# Altium integrated library WR-FPC_rev19a.IntLib: 242 symbols (part 1 of 2) (continued)
## 686118188622
designator J?
WR-FPC SMT LIF Horizontal Top Contact, pitch 1mm, 18p; Part Number: 686118188622; Contact Resistance: 30mOhm; Pin Number: 18; Working Voltage: 125VAC; Rated Current: 1A; ComponentLink1Description: Manufacturer; ComponentLink1URL: http://www.we-online.de; ComponentLink2Description: Datasheet; ComponentLink2URL: https://katalog.we-online.com/em/datasheet/686118188622.pdf; Packaging: Tape and Reel; Pitch: 1mm; Published Date: November 2019; Mounting Technology: SMT; Operating Temperature: -25 to +85degC; Length: 21.8mm; Type: Horizontal; Publisher: Wurth Elektronik
footprint 686118188622
pins: 1, 2, 3, 4, 5, 6, 7, 8, 9, 10, 11, 12, 13, 14, 15, 16, 17, 18, MP1, MP2

## 686118188822
designator J?
WR-FPC SMT LIF Vertical Type A, pitch 1mm, 18p; Part Number: 686118188822; Contact Resistance: 30mOhm; Pin Number: 18; Working Voltage: 125VAC; Rated Current: 1A; ComponentLink1Description: Manufacturer; ComponentLink1URL: http://www.we-online.de; ComponentLink2Description: Datasheet; ComponentLink2URL: https://katalog.we-online.com/em/datasheet/686118188822.pdf; Packaging: Tape and Reel; Pitch: 1mm; Published Date: November 2019; Mounting Technology: SMT; Operating Temperature: -25 to +85degC; Length: 21mm; Type: Vertical; Publisher: Wurth Elektronik
footprint 686118188822
pins: 1, 2, 3, 4, 5, 6, 7, 8, 9, 10, 11, 12, 13, 14, 15, 16, 17, 18

## 686120148922
designator J?
WR-FPC SMT ZIF Horizontal Bottom Contact Hinge Type, pitch 1mm, 20p; Part Number: 686120148922; Contact Resistance: 50mOhm; Pin Number: 20; Working Voltage: 100VAC; Rated Current: 1A; ComponentLink1Description: Manufacturer; ComponentLink1URL: http://www.we-online.de; ComponentLink2Description: Datasheet; ComponentLink2URL: https://katalog.we-online.com/em/datasheet/686120148922.pdf; Packaging: Tape and Reel; Pitch: 1mm; Published Date: November 2019; Mounting Technology: SMT; Operating Temperature: -25 to +85degC; Length: 24.6mm; Type: Horizontal; Publisher: Wurth Elektronik
footprint 686120148922
pins: 1, 2, 3, 4, 5, 6, 7, 8, 9, 10, 11, 12, 13, 14, 15, 16, 17, 18, 19, 20, MP1, MP2

## 686120183822
designator J?
WR-FPC SMT ZIF Vertical Type A, pitch 1mm, 20p; Part Number: 686120183822; Contact Resistance: 30mOhm; Pin Number: 20; Working Voltage: 125VAC; Rated Current: 1A; ComponentLink1Description: Manufacturer; ComponentLink1URL: http://www.we-online.de; ComponentLink2Description: Datasheet; ComponentLink2URL: https://katalog.we-online.com/em/datasheet/686120183822.pdf; Packaging: Tape and Reel; Pitch: 1mm; Published Date: November 2019; Mounting Technology: SMT; Operating Temperature: -25 to +85degC; Length: 26.8mm; Type: Vertical; Publisher: Wurth Elektronik
footprint 686120183822
pins: 1, 2, 3, 4, 5, 6, 7, 8, 9, 10, 11, 12, 13, 14, 15, 16, 17, 18, 19, 20, MP1, MP2, MP3, MP4

## 686120188622
designator J?
WR-FPC SMT LIF Horizontal Top Contact, pitch 1mm, 20p; Part Number: 686120188622; Contact Resistance: 30mOhm; Pin Number: 20; Working Voltage: 125VAC; Rated Current: 1A; ComponentLink1Description: Manufacturer; ComponentLink1URL: http://www.we-online.de; ComponentLink2Description: Datasheet; ComponentLink2URL: https://katalog.we-online.com/em/datasheet/686120188622.pdf; Packaging: Tape and Reel; Pitch: 1mm; Published Date: November 2019; Mounting Technology: SMT; Operating Temperature: -25 to +85degC; Length: 23.8mm; Type: Horizontal; Publisher: Wurth Elektronik
footprint 686120188622
pins: 1, 2, 3, 4, 5, 6, 7, 8, 9, 10, 11, 12, 13, 14, 15, 16, 17, 18, 19, 20, MP1, MP2

## 686120188822
designator J?
WR-FPC SMT LIF Vertical Type A, pitch 1mm, 20p; Part Number: 686120188822; Contact Resistance: 30mOhm; Pin Number: 20; Working Voltage: 125VAC; Rated Current: 1A; ComponentLink1Description: Manufacturer; ComponentLink1URL: http://www.we-online.de; ComponentLink2Description: Datasheet; ComponentLink2URL: https://katalog.we-online.com/em/datasheet/686120188822.pdf; Packaging: Tape and Reel; Pitch: 1mm; Published Date: November 2019; Mounting Technology: SMT; Operating Temperature: -25 to +85degC; Length: 23mm; Type: Vertical; Publisher: Wurth Elektronik
footprint 686120188822
pins: 1, 2, 3, 4, 5, 6, 7, 8, 9, 10, 11, 12, 13, 14, 15, 16, 17, 18, 19, 20

## 686122148922
designator J?
WR-FPC SMT ZIF Horizontal Bottom Contact Hinge Type, pitch 1mm, 22p; Part Number: 686122148922; Contact Resistance: 50mOhm; Pin Number: 22; Working Voltage: 100VAC; Rated Current: 1A; ComponentLink1Description: Manufacturer; ComponentLink1URL: http://www.we-online.de; ComponentLink2Description: Datasheet; ComponentLink2URL: https://katalog.we-online.com/em/datasheet/686122148922.pdf; Packaging: Tape and Reel; Pitch: 1mm; Published Date: November 2019; Mounting Technology: SMT; Operating Temperature: -25 to +85degC; Length: 26.6mm; Type: Horizontal; Publisher: Wurth Elektronik
footprint 686122148922
pins: 1, 2, 3, 4, 5, 6, 7, 8, 9, 10, 11, 12, 13, 14, 15, 16, 17, 18, 19, 20, 21, 22, MP1, MP2

## 686122183822
designator J?
WR-FPC SMT ZIF Vertical Type A, pitch 1mm, 22p; Part Number: 686122183822; Contact Resistance: 30mOhm; Pin Number: 22; Working Voltage: 125VAC; Rated Current: 1A; ComponentLink1Description: Manufacturer; ComponentLink1URL: http://www.we-online.de; ComponentLink2Description: Datasheet; ComponentLink2URL: https://katalog.we-online.com/em/datasheet/686122183822.pdf; Packaging: Tape and Reel; Pitch: 1mm; Published Date: November 2019; Mounting Technology: SMT; Operating Temperature: -25 to +85degC; Length: 28.8mm; Type: Vertical; Publisher: Wurth Elektronik
footprint 686122183822
pins: 1, 2, 3, 4, 5, 6, 7, 8, 9, 10, 11, 12, 13, 14, 15, 16, 17, 18, 19, 20, 21, 22, MP1, MP2, MP3, MP4

## 686122188622
designator J?
WR-FPC SMT LIF Horizontal Top Contact, pitch 1mm, 22p; Part Number: 686122188622; Contact Resistance: 30mOhm; Pin Number: 22; Working Voltage: 125VAC; Rated Current: 1A; ComponentLink1Description: Manufacturer; ComponentLink1URL: http://www.we-online.de; ComponentLink2Description: Datasheet; ComponentLink2URL: https://katalog.we-online.com/em/datasheet/686122188622.pdf; Packaging: Tape and Reel; Pitch: 1mm; Published Date: November 2019; Mounting Technology: SMT; Operating Temperature: -25 to +85degC; Length: 25.8mm; Type: Horizontal; Publisher: Wurth Elektronik
footprint 686122188622
pins: 1, 2, 3, 4, 5, 6, 7, 8, 9, 10, 11, 12, 13, 14, 15, 16, 17, 18, 19, 20, 21, 22, MP1, MP2

## 686122188822
designator J?
WR-FPC SMT LIF Vertical Type A, pitch 1mm, 22p; Part Number: 686122188822; Contact Resistance: 30mOhm; Pin Number: 22; Working Voltage: 125VAC; Rated Current: 1A; ComponentLink1Description: Manufacturer; ComponentLink1URL: http://www.we-online.de; ComponentLink2Description: Datasheet; ComponentLink2URL: https://katalog.we-online.com/em/datasheet/686122188822.pdf; Packaging: Tape and Reel; Pitch: 1mm; Published Date: November 2019; Mounting Technology: SMT; Operating Temperature: -25 to +85degC; Length: 25mm; Type: Vertical; Publisher: Wurth Elektronik
footprint 686122188822
pins: 1, 2, 3, 4, 5, 6, 7, 8, 9, 10, 11, 12, 13, 14, 15, 16, 17, 18, 19, 20, 21, 22

## 686124148922
designator J?
WR-FPC SMT ZIF Horizontal Bottom Contact Hinge Type, pitch 1mm, 24p; Part Number: 686124148922; Contact Resistance: 50mOhm; Pin Number: 24; Working Voltage: 100VAC; Rated Current: 1A; ComponentLink1Description: Manufacturer; ComponentLink1URL: http://www.we-online.de; ComponentLink2Description: Datasheet; ComponentLink2URL: https://katalog.we-online.com/em/datasheet/686124148922.pdf; Packaging: Tape and Reel; Pitch: 1mm; Published Date: November 2019; Mounting Technology: SMT; Operating Temperature: -25 to +85degC; Length: 28.6mm; Type: Horizontal; Publisher: Wurth Elektronik
footprint 686124148922
pins: 1, 2, 3, 4, 5, 6, 7, 8, 9, 10, 11, 12, 13, 14, 15, 16, 17, 18, 19, 20, 21, 22, 23, 24, MP1, MP2

## 686124183822
designator J?
WR-FPC SMT ZIF Vertical Type A, pitch 1mm, 24p; Part Number: 686124183822; Contact Resistance: 30mOhm; Pin Number: 24; Working Voltage: 125VAC; Rated Current: 1A; ComponentLink1Description: Manufacturer; ComponentLink1URL: http://www.we-online.de; ComponentLink2Description: Datasheet; ComponentLink2URL: https://katalog.we-online.com/em/datasheet/686124183822.pdf; Packaging: Tape and Reel; Pitch: 1mm; Published Date: November 2019; Mounting Technology: SMT; Operating Temperature: -25 to +85degC; Length: 30.8mm; Type: Vertical; Publisher: Wurth Elektronik
footprint 686124183822
pins: 1, 2, 3, 4, 5, 6, 7, 8, 9, 10, 11, 12, 13, 14, 15, 16, 17, 18, 19, 20, 21, 22, 23, 24, MP1, MP2, MP3, MP4

## 686124188622
designator J?
WR-FPC SMT LIF Horizontal Top Contact, pitch 1mm, 24p; Part Number: 686124188622; Contact Resistance: 30mOhm; Pin Number: 24; Working Voltage: 125VAC; Rated Current: 1A; ComponentLink1Description: Manufacturer; ComponentLink1URL: http://www.we-online.de; ComponentLink2Description: Datasheet; ComponentLink2URL: https://katalog.we-online.com/em/datasheet/686124188622.pdf; Packaging: Tape and Reel; Pitch: 1mm; Published Date: November 2019; Mounting Technology: SMT; Operating Temperature: -25 to +85degC; Length: 27.8mm; Type: Horizontal; Publisher: Wurth Elektronik
footprint 686124188622
pins: 1, 2, 3, 4, 5, 6, 7, 8, 9, 10, 11, 12, 13, 14, 15, 16, 17, 18, 19, 20, 21, 22, 23, 24, MP1, MP2

## 686124188822
designator J?
WR-FPC SMT LIF Vertical Type A, pitch 1mm, 24p; Part Number: 686124188822; Contact Resistance: 30mOhm; Pin Number: 24; Working Voltage: 125VAC; Rated Current: 1A; ComponentLink1Description: Manufacturer; ComponentLink1URL: http://www.we-online.de; ComponentLink2Description: Datasheet; ComponentLink2URL: https://katalog.we-online.com/em/datasheet/686124188822.pdf; Packaging: Tape and Reel; Pitch: 1mm; Published Date: November 2019; Mounting Technology: SMT; Operating Temperature: -25 to +85degC; Length: 27mm; Type: Vertical; Publisher: Wurth Elektronik
footprint 686124188822
pins: 1, 2, 3, 4, 5, 6, 7, 8, 9, 10, 11, 12, 13, 14, 15, 16, 17, 18, 19, 20, 21, 22, 23, 24

## 686126148922
designator J?
WR-FPC SMT ZIF Horizontal Bottom Contact Hinge Type, pitch 1mm, 26p; Part Number: 686126148922; Contact Resistance: 50mOhm; Pin Number: 26; Working Voltage: 100VAC; Rated Current: 1A; ComponentLink1Description: Manufacturer; ComponentLink1URL: http://www.we-online.de; ComponentLink2Description: Datasheet; ComponentLink2URL: https://katalog.we-online.com/em/datasheet/686126148922.pdf; Packaging: Tape and Reel; Pitch: 1mm; Published Date: November 2019; Mounting Technology: SMT; Operating Temperature: -25 to +85degC; Length: 30.6mm; Type: Horizontal; Publisher: Wurth Elektronik
footprint 686126148922
pins: 1, 2, 3, 4, 5, 6, 7, 8, 9, 10, 11, 12, 13, 14, 15, 16, 17, 18, 19, 20, 21, 22, 23, 24, 25, 26, MP1, MP2

## 686126188622
designator J?
WR-FPC SMT LIF Horizontal Top Contact, pitch 1mm, 26p; Part Number: 686126188622; Contact Resistance: 30mOhm; Pin Number: 26; Working Voltage: 125VAC; Rated Current: 1A; ComponentLink1Description: Manufacturer; ComponentLink1URL: http://www.we-online.de; ComponentLink2Description: Datasheet; ComponentLink2URL: https://katalog.we-online.com/em/datasheet/686126188622.pdf; Packaging: Tape and Reel; Pitch: 1mm; Published Date: November 2019; Mounting Technology: SMT; Operating Temperature: -25 to +85degC; Length: 29.8mm; Type: Horizontal; Publisher: Wurth Elektronik
footprint 686126188622
pins: 1, 2, 3, 4, 5, 6, 7, 8, 9, 10, 11, 12, 13, 14, 15, 16, 17, 18, 19, 20, 21, 22, 23, 24, 25, 26, MP1, MP2

## 686126188822
designator J?
WR-FPC SMT LIF Vertical Type A, pitch 1mm, 26p; Part Number: 686126188822; Contact Resistance: 30mOhm; Pin Number: 26; Working Voltage: 125VAC; Rated Current: 1A; ComponentLink1Description: Manufacturer; ComponentLink1URL: http://www.we-online.de; ComponentLink2Description: Datasheet; ComponentLink2URL: https://katalog.we-online.com/em/datasheet/686126188822.pdf; Packaging: Tape and Reel; Pitch: 1mm; Published Date: November 2019; Mounting Technology: SMT; Operating Temperature: -25 to +85degC; Length: 29mm; Type: Vertical; Publisher: Wurth Elektronik
footprint 686126188822
pins: 1, 2, 3, 4, 5, 6, 7, 8, 9, 10, 11, 12, 13, 14, 15, 16, 17, 18, 19, 20, 21, 22, 23, 24, 25, 26

## 686128148922
designator J?
WR-FPC SMT ZIF Horizontal Bottom Contact Hinge Type, pitch 1mm, 28p; Part Number: 686128148922; Contact Resistance: 50mOhm; Pin Number: 28; Working Voltage: 100VAC; Rated Current: 1A; ComponentLink1Description: Manufacturer; ComponentLink1URL: http://www.we-online.de; ComponentLink2Description: Datasheet; ComponentLink2URL: https://katalog.we-online.com/em/datasheet/686128148922.pdf; Packaging: Tape and Reel; Pitch: 1mm; Published Date: November 2019; Mounting Technology: SMT; Operating Temperature: -25 to +85degC; Length: 32.6mm; Type: Horizontal; Publisher: Wurth Elektronik
footprint 686128148922
pins: 1, 2, 3, 4, 5, 6, 7, 8, 9, 10, 11, 12, 13, 14, 15, 16, 17, 18, 19, 20, 21, 22, 23, 24, 25, 26, 27, 28, MP1, MP2

## 686128188622
designator J?
WR-FPC SMT LIF Horizontal Top Contact, pitch 1mm, 28p; Part Number: 686128188622; Contact Resistance: 30mOhm; Pin Number: 28; Working Voltage: 125VAC; Rated Current: 1A; ComponentLink1Description: Manufacturer; ComponentLink1URL: http://www.we-online.de; ComponentLink2Description: Datasheet; ComponentLink2URL: https://katalog.we-online.com/em/datasheet/686128188622.pdf; Packaging: Tape and Reel; Pitch: 1mm; Published Date: November 2019; Mounting Technology: SMT; Operating Temperature: -25 to +85degC; Length: 31.8mm; Type: Horizontal; Publisher: Wurth Elektronik
footprint 686128188622
pins: 1, 2, 3, 4, 5, 6, 7, 8, 9, 10, 11, 12, 13, 14, 15, 16, 17, 18, 19, 20, 21, 22, 23, 24, 25, 26, 27, 28, MP1, MP2

## 686128188822
designator J?
WR-FPC SMT LIF Vertical Type A, pitch 1mm, 28p; Part Number: 686128188822; Contact Resistance: 30mOhm; Pin Number: 28; Working Voltage: 125VAC; Rated Current: 1A; ComponentLink1Description: Manufacturer; ComponentLink1URL: http://www.we-online.de; ComponentLink2Description: Datasheet; ComponentLink2URL: https://katalog.we-online.com/em/datasheet/686128188822.pdf; Packaging: Tape and Reel; Pitch: 1mm; Published Date: November 2019; Mounting Technology: SMT; Operating Temperature: -25 to +85degC; Length: 31mm; Type: Vertical; Publisher: Wurth Elektronik
footprint 686128188822
pins: 1, 2, 3, 4, 5, 6, 7, 8, 9, 10, 11, 12, 13, 14, 15, 16, 17, 18, 19, 20, 21, 22, 23, 24, 25, 26, 27, 28

## 686130148922
designator J?
WR-FPC SMT ZIF Horizontal Bottom Contact Hinge Type, pitch 1mm, 30p; Part Number: 686130148922; Contact Resistance: 50mOhm; Pin Number: 30; Working Voltage: 100VAC; Rated Current: 1A; ComponentLink1Description: Manufacturer; ComponentLink1URL: http://www.we-online.de; ComponentLink2Description: Datasheet; ComponentLink2URL: https://katalog.we-online.com/em/datasheet/686130148922.pdf; Packaging: Tape and Reel; Pitch: 1mm; Published Date: November 2019; Mounting Technology: SMT; Operating Temperature: -25 to +85degC; Length: 34.6mm; Type: Horizontal; Publisher: Wurth Elektronik
footprint 686130148922
pins: 1, 2, 3, 4, 5, 6, 7, 8, 9, 10, 11, 12, 13, 14, 15, 16, 17, 18, 19, 20, 21, 22, 23, 24, 25, 26, 27, 28, 29, 30, MP1, MP2

## 686130188622
designator J?
WR-FPC SMT LIF Horizontal Top Contact, pitch 1mm, 30p; Part Number: 686130188622; Contact Resistance: 30mOhm; Pin Number: 30; Working Voltage: 125VAC; Rated Current: 1A; ComponentLink1Description: Manufacturer; ComponentLink1URL: http://www.we-online.de; ComponentLink2Description: Datasheet; ComponentLink2URL: https://katalog.we-online.com/em/datasheet/686130188622.pdf; Packaging: Tape and Reel; Pitch: 1mm; Published Date: November 2019; Mounting Technology: SMT; Operating Temperature: -25 to +85degC; Length: 33.8mm; Type: Horizontal; Publisher: Wurth Elektronik
footprint 686130188622
pins: 1, 2, 3, 4, 5, 6, 7, 8, 9, 10, 11, 12, 13, 14, 15, 16, 17, 18, 19, 20, 21, 22, 23, 24, 25, 26, 27, 28, 29, 30, MP1, MP2

## 686130188822
designator J?
WR-FPC SMT LIF Vertical Type A, pitch 1mm, 30p; Part Number: 686130188822; Contact Resistance: 30mOhm; Pin Number: 30; Working Voltage: 125VAC; Rated Current: 1A; ComponentLink1Description: Manufacturer; ComponentLink1URL: http://www.we-online.de; ComponentLink2Description: Datasheet; ComponentLink2URL: https://katalog.we-online.com/em/datasheet/686130188822.pdf; Packaging: Tape and Reel; Pitch: 1mm; Published Date: November 2019; Mounting Technology: SMT; Operating Temperature: -25 to +85degC; Length: 33mm; Type: Vertical; Publisher: Wurth Elektronik
footprint 686130188822
pins: 1, 2, 3, 4, 5, 6, 7, 8, 9, 10, 11, 12, 13, 14, 15, 16, 17, 18, 19, 20, 21, 22, 23, 24, 25, 26, 27, 28, 29, 30


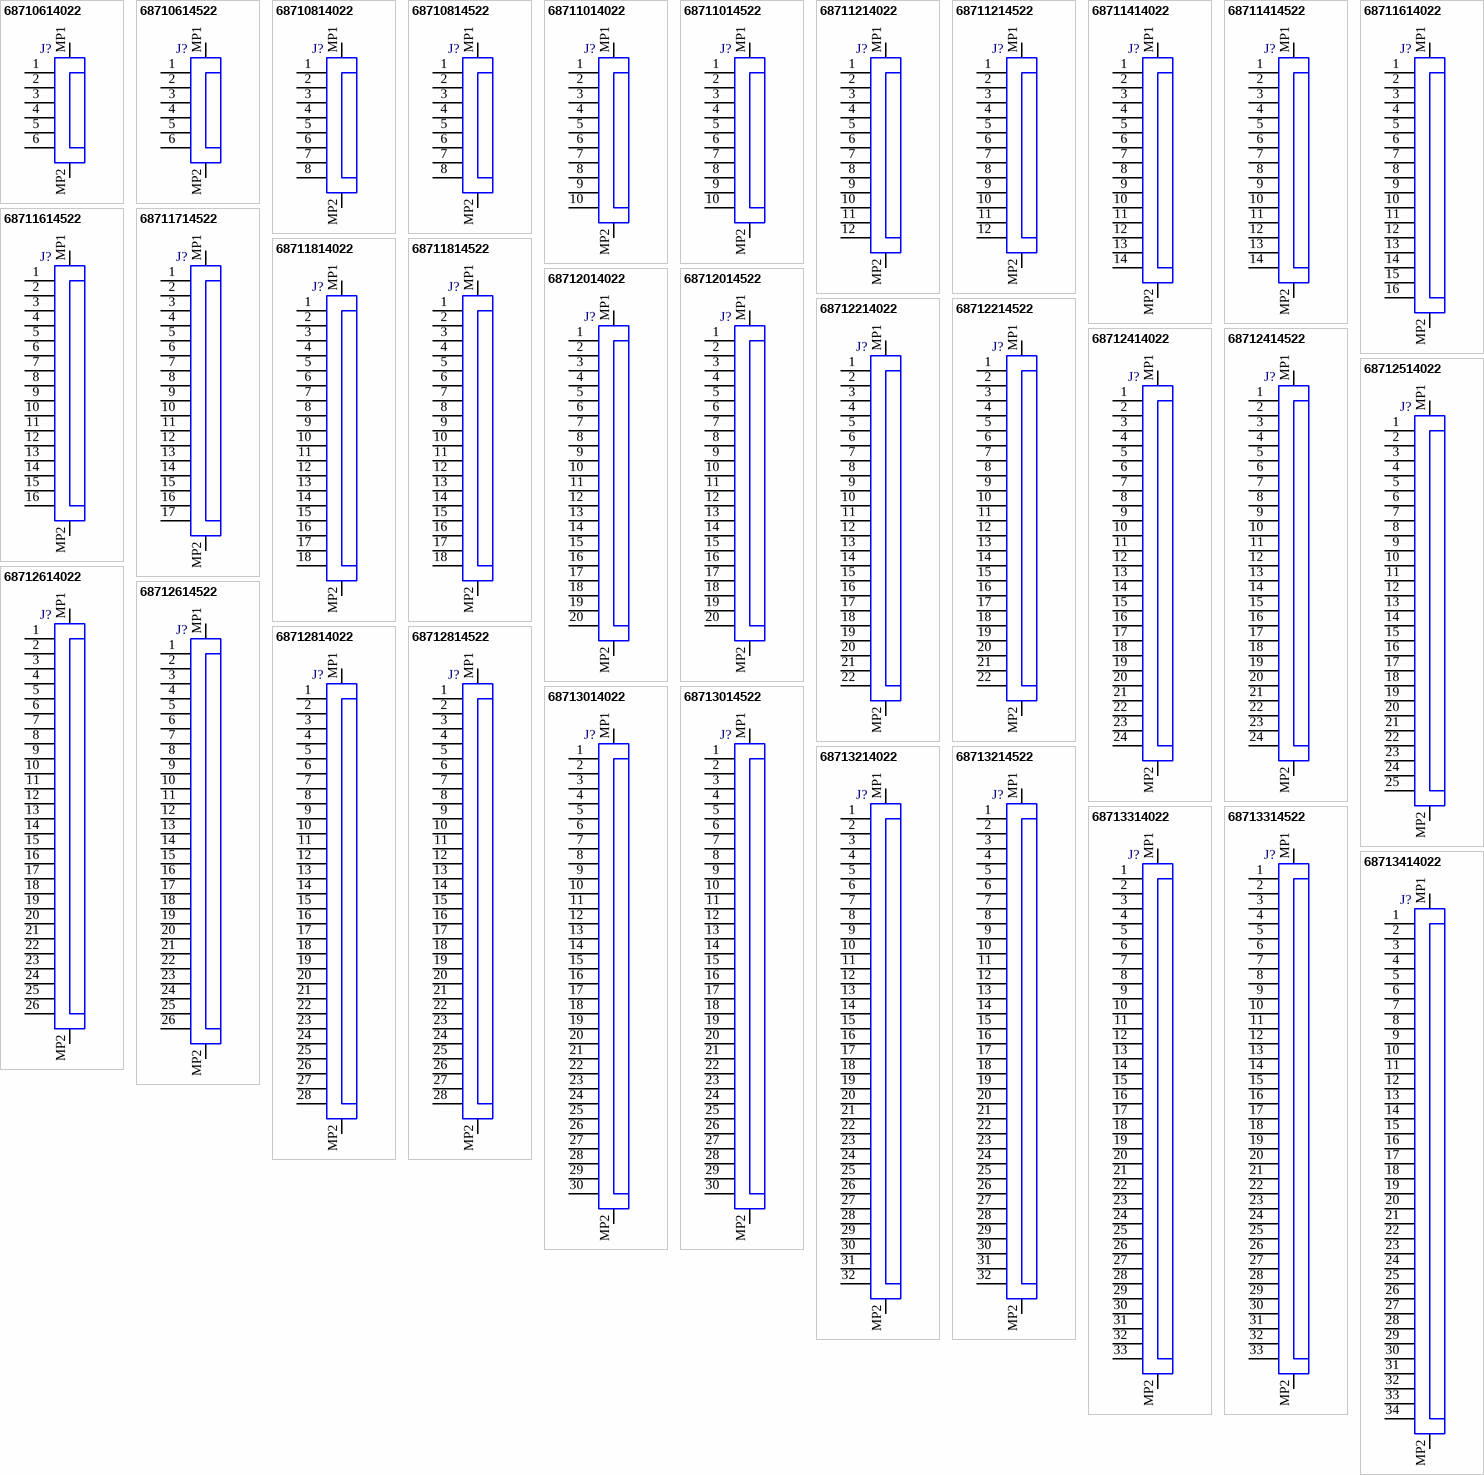
[diagram p3: symbols 68710614022 to 68713414022]

## 68710614022
designator J?
WR-FPC SMT ZIF Horizontal Top Contact, pitch 0.5mm, 6p; Part Number: 68710614022; Contact Resistance: 20mOhm; Pin Number: 6; Working Voltage: 50VAC; Rated Current: 0.5A; ComponentLink1Description: Manufacturer; ComponentLink1URL: http://www.we-online.de; ComponentLink2Description: Datasheet; ComponentLink2URL: https://katalog.we-online.com/em/datasheet/68710614022.pdf; Packaging: Tape and Reel; Pitch: 0.5mm; Published Date: November 2019; Mounting Technology: SMT; Operating Temperature: -25 to +85degC; Length: 9.4mm; Type: Horizontal; Publisher: Wurth Elektronik
footprint 68710614022
pins: 1, 2, 3, 4, 5, 6, MP1, MP2

## 68710614522
designator J?
WR-FPC SMT ZIF Horizontal Bottom Contact, pitch 0.5mm, 6p; Part Number: 68710614522; Contact Resistance: 20mOhm; Pin Number: 6; Working Voltage: 50VAC; Rated Current: 0.5A; ComponentLink1Description: Manufacturer; ComponentLink1URL: http://www.we-online.de; ComponentLink2Description: Datasheet; ComponentLink2URL: https://katalog.we-online.com/em/datasheet/68710614522.pdf; Packaging: Tape and Reel; Pitch: 0.5mm; Published Date: November 2019; Mounting Technology: SMT; Operating Temperature: -25 to +85degC; Length: 9.4mm; Type: Horizontal; Publisher: Wurth Elektronik
footprint 68710614522
pins: 1, 2, 3, 4, 5, 6, MP1, MP2

## 68710814022
designator J?
WR-FPC SMT ZIF Horizontal Top Contact, pitch 0.5mm, 8p; Part Number: 68710814022; Contact Resistance: 20mOhm; Pin Number: 8; Working Voltage: 50VAC; Rated Current: 0.5A; ComponentLink1Description: Manufacturer; ComponentLink1URL: http://www.we-online.de; ComponentLink2Description: Datasheet; ComponentLink2URL: https://katalog.we-online.com/em/datasheet/68710814022.pdf; Packaging: Tape and Reel; Pitch: 0.5mm; Published Date: November 2019; Mounting Technology: SMT; Operating Temperature: -25 to +85degC; Length: 10.4mm; Type: Horizontal; Publisher: Wurth Elektronik
footprint 68710814022
pins: 1, 2, 3, 4, 5, 6, 7, 8, MP1, MP2

## 68710814522
designator J?
WR-FPC SMT ZIF Horizontal Bottom Contact, pitch 0.5mm, 8p; Part Number: 68710814522; Contact Resistance: 20mOhm; Pin Number: 8; Working Voltage: 50VAC; Rated Current: 0.5A; ComponentLink1Description: Manufacturer; ComponentLink1URL: http://www.we-online.de; ComponentLink2Description: Datasheet; ComponentLink2URL: https://katalog.we-online.com/em/datasheet/68710814522.pdf; Packaging: Tape and Reel; Pitch: 0.5mm; Published Date: November 2019; Mounting Technology: SMT; Operating Temperature: -25 to +85degC; Length: 10.4mm; Type: Horizontal; Publisher: Wurth Elektronik
footprint 68710814522
pins: 1, 2, 3, 4, 5, 6, 7, 8, MP1, MP2

## 68711014022
designator J?
WR-FPC SMT ZIF Horizontal Top Contact, pitch 0.5mm, 10p; Part Number: 68711014022; Contact Resistance: 20mOhm; Pin Number: 10; Working Voltage: 50VAC; Rated Current: 0.5A; ComponentLink1Description: Manufacturer; ComponentLink1URL: http://www.we-online.de; ComponentLink2Description: Datasheet; ComponentLink2URL: https://katalog.we-online.com/em/datasheet/68711014022.pdf; Packaging: Tape and Reel; Pitch: 0.5mm; Published Date: November 2019; Mounting Technology: SMT; Operating Temperature: -25 to +85degC; Length: 11.4mm; Type: Horizontal; Publisher: Wurth Elektronik
footprint 68711014022
pins: 1, 2, 3, 4, 5, 6, 7, 8, 9, 10, MP1, MP2

## 68711014522
designator J?
WR-FPC SMT ZIF Horizontal Bottom Contact, pitch 0.5mm, 10p; Part Number: 68711014522; Contact Resistance: 20mOhm; Pin Number: 10; Working Voltage: 50VAC; Rated Current: 0.5A; ComponentLink1Description: Manufacturer; ComponentLink1URL: http://www.we-online.de; ComponentLink2Description: Datasheet; ComponentLink2URL: https://katalog.we-online.com/em/datasheet/68711014522.pdf; Packaging: Tape and Reel; Pitch: 0.5mm; Published Date: November 2019; Mounting Technology: SMT; Operating Temperature: -25 to +85degC; Length: 11.4mm; Type: Horizontal; Publisher: Wurth Elektronik
footprint 68711014522
pins: 1, 2, 3, 4, 5, 6, 7, 8, 9, 10, MP1, MP2

## 68711214022
designator J?
WR-FPC SMT ZIF Horizontal Top Contact, pitch 0.5mm, 12p; Part Number: 68711214022; Contact Resistance: 20mOhm; Pin Number: 12; Working Voltage: 50VAC; Rated Current: 0.5A; ComponentLink1Description: Manufacturer; ComponentLink1URL: http://www.we-online.de; ComponentLink2Description: Datasheet; ComponentLink2URL: https://katalog.we-online.com/em/datasheet/68711214022.pdf; Packaging: Tape and Reel; Pitch: 0.5mm; Published Date: November 2019; Mounting Technology: SMT; Operating Temperature: -25 to +85degC; Length: 12.4mm; Type: Horizontal; Publisher: Wurth Elektronik
footprint 68711214022
pins: 1, 2, 3, 4, 5, 6, 7, 8, 9, 10, 11, 12, MP1, MP2

## 68711214522
designator J?
WR-FPC SMT ZIF Horizontal Bottom Contact, pitch 0.5mm, 12p; Part Number: 68711214522; Contact Resistance: 20mOhm; Pin Number: 12; Working Voltage: 50VAC; Rated Current: 0.5A; ComponentLink1Description: Manufacturer; ComponentLink1URL: http://www.we-online.de; ComponentLink2Description: Datasheet; ComponentLink2URL: https://katalog.we-online.com/em/datasheet/68711214522.pdf; Packaging: Tape and Reel; Pitch: 0.5mm; Published Date: November 2019; Mounting Technology: SMT; Operating Temperature: -25 to +85degC; Length: 12.4mm; Type: Horizontal; Publisher: Wurth Elektronik
footprint 68711214522
pins: 1, 2, 3, 4, 5, 6, 7, 8, 9, 10, 11, 12, MP1, MP2

## 68711414022
designator J?
WR-FPC SMT ZIF Horizontal Top Contact, pitch 0.5mm, 14p; Part Number: 68711414022; Contact Resistance: 20mOhm; Pin Number: 14; Working Voltage: 50VAC; Rated Current: 0.5A; ComponentLink1Description: Manufacturer; ComponentLink1URL: http://www.we-online.de; ComponentLink2Description: Datasheet; ComponentLink2URL: https://katalog.we-online.com/em/datasheet/68711414022.pdf; Packaging: Tape and Reel; Pitch: 0.5mm; Published Date: November 2019; Mounting Technology: SMT; Operating Temperature: -25 to +85degC; Length: 13.4mm; Type: Horizontal; Publisher: Wurth Elektronik
footprint 68711414022
pins: 1, 2, 3, 4, 5, 6, 7, 8, 9, 10, 11, 12, 13, 14, MP1, MP2

## 68711414522
designator J?
WR-FPC SMT ZIF Horizontal Bottom Contact, pitch 0.5mm, 14p; Part Number: 68711414522; Contact Resistance: 20mOhm; Pin Number: 14; Working Voltage: 50VAC; Rated Current: 0.5A; ComponentLink1Description: Manufacturer; ComponentLink1URL: http://www.we-online.de; ComponentLink2Description: Datasheet; ComponentLink2URL: https://katalog.we-online.com/em/datasheet/68711414522.pdf; Packaging: Tape and Reel; Pitch: 0.5mm; Published Date: November 2019; Mounting Technology: SMT; Operating Temperature: -25 to +85degC; Length: 13.4mm; Type: Horizontal; Publisher: Wurth Elektronik
footprint 68711414522
pins: 1, 2, 3, 4, 5, 6, 7, 8, 9, 10, 11, 12, 13, 14, MP1, MP2

## 68711614022
designator J?
WR-FPC SMT ZIF Horizontal Top Contact, pitch 0.5mm, 16p; Part Number: 68711614022; Contact Resistance: 20mOhm; Pin Number: 16; Working Voltage: 50VAC; Rated Current: 0.5A; ComponentLink1Description: Manufacturer; ComponentLink1URL: http://www.we-online.de; ComponentLink2Description: Datasheet; ComponentLink2URL: https://katalog.we-online.com/em/datasheet/68711614022.pdf; Packaging: Tape and Reel; Pitch: 0.5mm; Published Date: November 2019; Mounting Technology: SMT; Operating Temperature: -25 to +85degC; Length: 14.4mm; Type: Horizontal; Publisher: Wurth Elektronik
footprint 68711614022
pins: 1, 2, 3, 4, 5, 6, 7, 8, 9, 10, 11, 12, 13, 14, 15, 16, MP1, MP2

## 68711614522
designator J?
WR-FPC SMT ZIF Horizontal Bottom Contact, pitch 0.5mm, 16p; Part Number: 68711614522; Contact Resistance: 20mOhm; Pin Number: 16; Working Voltage: 50VAC; Rated Current: 0.5A; ComponentLink1Description: Manufacturer; ComponentLink1URL: http://www.we-online.de; ComponentLink2Description: Datasheet; ComponentLink2URL: https://katalog.we-online.com/em/datasheet/68711614522.pdf; Packaging: Tape and Reel; Pitch: 0.5mm; Published Date: November 2019; Mounting Technology: SMT; Operating Temperature: -25 to +85degC; Length: 14.4mm; Type: Horizontal; Publisher: Wurth Elektronik
footprint 68711614522
pins: 1, 2, 3, 4, 5, 6, 7, 8, 9, 10, 11, 12, 13, 14, 15, 16, MP1, MP2

## 68711714522
designator J?
WR-FPC SMT ZIF Horizontal Bottom Contact, pitch 0.5mm, 17p; Part Number: 68711714522; Contact Resistance: 20mOhm; Pin Number: 17; Working Voltage: 50VAC; Rated Current: 0.5A; ComponentLink1Description: Manufacturer; ComponentLink1URL: http://www.we-online.de; ComponentLink2Description: Datasheet; ComponentLink2URL: https://katalog.we-online.com/em/datasheet/68711714522.pdf; Packaging: Tape and Reel; Pitch: 0.5mm; Published Date: November 2019; Mounting Technology: SMT; Operating Temperature: -25 to +85degC; Length: 14.9mm; Type: Horizontal; Publisher: Wurth Elektronik
footprint 68711714522
pins: 1, 2, 3, 4, 5, 6, 7, 8, 9, 10, 11, 12, 13, 14, 15, 16, 17, MP1, MP2
1 alternate drawing of the same symbol

## 68711814022
designator J?
WR-FPC SMT ZIF Horizontal Top Contact, pitch 0.5mm, 18p; Part Number: 68711814022; Contact Resistance: 20mOhm; Pin Number: 18; Working Voltage: 50VAC; Rated Current: 0.5A; ComponentLink1Description: Manufacturer; ComponentLink1URL: http://www.we-online.de; ComponentLink2Description: Datasheet; ComponentLink2URL: https://katalog.we-online.com/em/datasheet/68711814022.pdf; Packaging: Tape and Reel; Pitch: 0.5mm; Published Date: November 2019; Mounting Technology: SMT; Operating Temperature: -25 to +85degC; Length: 15.4mm; Type: Horizontal; Publisher: Wurth Elektronik
footprint 68711814022
pins: 1, 2, 3, 4, 5, 6, 7, 8, 9, 10, 11, 12, 13, 14, 15, 16, 17, 18, MP1, MP2

## 68711814522
designator J?
WR-FPC SMT ZIF Horizontal Bottom Contact, pitch 0.5mm, 18p; Part Number: 68711814522; Contact Resistance: 20mOhm; Pin Number: 18; Working Voltage: 50VAC; Rated Current: 0.5A; ComponentLink1Description: Manufacturer; ComponentLink1URL: http://www.we-online.de; ComponentLink2Description: Datasheet; ComponentLink2URL: https://katalog.we-online.com/em/datasheet/68711814522.pdf; Packaging: Tape and Reel; Pitch: 0.5mm; Published Date: November 2019; Mounting Technology: SMT; Operating Temperature: -25 to +85degC; Length: 15.4mm; Type: Horizontal; Publisher: Wurth Elektronik
footprint 68711814522
pins: 1, 2, 3, 4, 5, 6, 7, 8, 9, 10, 11, 12, 13, 14, 15, 16, 17, 18, MP1, MP2

## 68712014022
designator J?
WR-FPC SMT ZIF Horizontal Top Contact, pitch 0.5mm, 20p; Part Number: 68712014022; Contact Resistance: 20mOhm; Pin Number: 20; Working Voltage: 50VAC; Rated Current: 0.5A; ComponentLink1Description: Manufacturer; ComponentLink1URL: http://www.we-online.de; ComponentLink2Description: Datasheet; ComponentLink2URL: https://katalog.we-online.com/em/datasheet/68712014022.pdf; Packaging: Tape and Reel; Pitch: 0.5mm; Published Date: November 2019; Mounting Technology: SMT; Operating Temperature: -25 to +85degC; Length: 16.4mm; Type: Horizontal; Publisher: Wurth Elektronik
footprint 68712014022
pins: 1, 2, 3, 4, 5, 6, 7, 8, 9, 10, 11, 12, 13, 14, 15, 16, 17, 18, 19, 20, MP1, MP2

## 68712014522
designator J?
WR-FPC SMT ZIF Horizontal Bottom Contact, pitch 0.5mm, 20p; Part Number: 68712014522; Contact Resistance: 20mOhm; Pin Number: 20; Working Voltage: 50VAC; Rated Current: 0.5A; ComponentLink1Description: Manufacturer; ComponentLink1URL: http://www.we-online.de; ComponentLink2Description: Datasheet; ComponentLink2URL: https://katalog.we-online.com/em/datasheet/68712014522.pdf; Packaging: Tape and Reel; Pitch: 0.5mm; Published Date: November 2019; Mounting Technology: SMT; Operating Temperature: -25 to +85degC; Length: 16.4mm; Type: Horizontal; Publisher: Wurth Elektronik
footprint 68712014522
pins: 1, 2, 3, 4, 5, 6, 7, 8, 9, 10, 11, 12, 13, 14, 15, 16, 17, 18, 19, 20, MP1, MP2

## 68712214022
designator J?
WR-FPC SMT ZIF Horizontal Top Contact, pitch 0.5mm, 22p; Part Number: 68712214022; Contact Resistance: 20mOhm; Pin Number: 22; Working Voltage: 50VAC; Rated Current: 0.5A; ComponentLink1Description: Manufacturer; ComponentLink1URL: http://www.we-online.de; ComponentLink2Description: Datasheet; ComponentLink2URL: https://katalog.we-online.com/em/datasheet/68712214022.pdf; Packaging: Tape and Reel; Pitch: 0.5mm; Published Date: November 2019; Mounting Technology: SMT; Operating Temperature: -25 to +85degC; Length: 17.4mm; Type: Horizontal; Publisher: Wurth Elektronik
footprint 68712214022
pins: 1, 2, 3, 4, 5, 6, 7, 8, 9, 10, 11, 12, 13, 14, 15, 16, 17, 18, 19, 20, 21, 22, MP1, MP2

## 68712214522
designator J?
WR-FPC SMT ZIF Horizontal Bottom Contact, pitch 0.5mm, 22p; Part Number: 68712214522; Contact Resistance: 20mOhm; Pin Number: 22; Working Voltage: 50VAC; Rated Current: 0.5A; ComponentLink1Description: Manufacturer; ComponentLink1URL: http://www.we-online.de; ComponentLink2Description: Datasheet; ComponentLink2URL: https://katalog.we-online.com/em/datasheet/68712214522.pdf; Packaging: Tape and Reel; Pitch: 0.5mm; Published Date: November 2019; Mounting Technology: SMT; Operating Temperature: -25 to +85degC; Length: 17.4mm; Type: Horizontal; Publisher: Wurth Elektronik
footprint 68712214522
pins: 1, 2, 3, 4, 5, 6, 7, 8, 9, 10, 11, 12, 13, 14, 15, 16, 17, 18, 19, 20, 21, 22, MP1, MP2
